# Altium footprint library Dart_Controller_Pcblib.PcbLib: 43 footprints (part 2 of 3)
Each footprint in its own frame and in the unit in brackets; x right, y up, seen from the top. Pads: shape width x height; smd on the part's side, far side on the other; paste and mask are expansions set on the pad; w line width, h text height; cw(c..) or ccw(c..) is an arc to the next point about the centre after c.
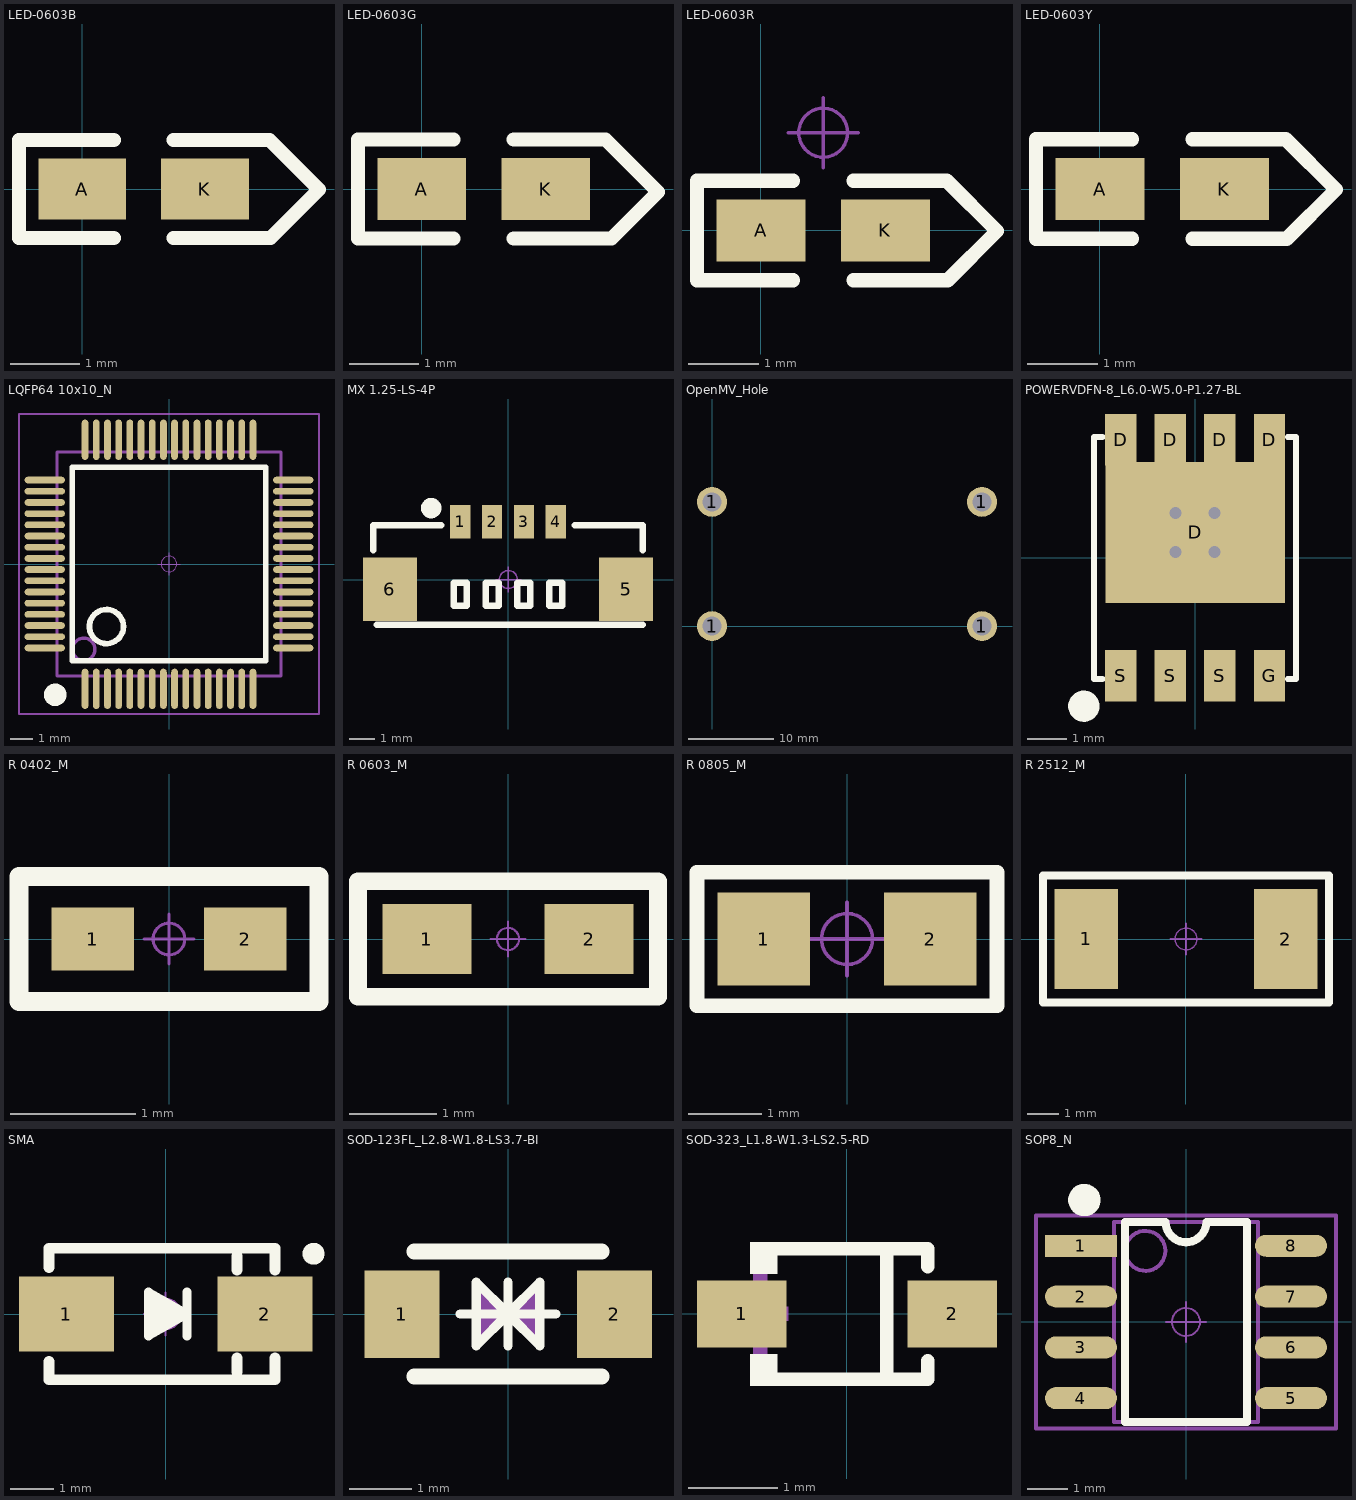
[diagram p1: the footprints below, top view; thin cyan lines are the x and y axes]

## LED-0603B [mil]
height 35.43
pads (2):
  rect 50x35 smd: A(0,0.26) K(70,0.26)
Top Overlay:
  lines w8: 18,-27.74 -36,-27.74 -36,-25.74 -36,28.26 -35,28.26 18,28.26 ; 52,-27.74 107.26,-27.74 135,0 106.74,28.26 106,28.26 52,28.26
3D body "18.STEP": height 23.82, standoff -0.04, extent 3.5,-15 66.5,16.58

## LED-0603G [mil]
height 35.43
pads (2):
  rect 50x35 smd: A(0,0.26) K(70,0.26)
Top Overlay:
  lines w8: 18,-27.74 -36,-27.74 -36,-25.74 -36,28.26 -35,28.26 18,28.26 ; 52,-27.74 107.26,-27.74 133.5,-1.5 103.75,28.26 52,28.26
3D body "17.STEP": height 23.82, standoff -0.04, extent 3.5,-15 66.5,16.58

## LED-0603R [mil]
height 35.43
pads (2):
  rect 50x35 smd: A(0,0) K(70,0)
Top Overlay:
  lines w8: 18,-28 -36,-28 -36,-26 -36,28 -35,28 18,28 ; 52,-28 105,-28 132.75,-0.26 104.49,28 ; 52,28 104.49,28 ; 103.75,28 104.49,28
Mechanical 15:
  circle w1.97: c35,55 r13.78
  lines w1.97: 15.31,55 54.69,55 ; 35,35.31 35,74.69
3D body "LED 0603玻璃罩.": height 0, standoff 0, extent 35,55 35,55
3D body "LED 0603-R.STEP": height 18.36, standoff -0.16, extent 3.5,39.21 66.49,70.78

## LED-0603Y [mil]
height 35.43
pads (2):
  rect 50x35 smd: A(0,0) K(70,0)
Top Overlay:
  lines w8: 18,-28 -36,-28 -36,-26 -36,28 -35,28 18,28 ; 52,-28 105,-28 132.75,-0.26 104.49,28 ; 52,28 104.49,28 ; 103.75,28 104.49,28
3D body "14.STEP": height 23.82, standoff -0.04, extent 3.5,-16.83 66.5,15

## LQFP64 10x10_N [mm]
pads (64):
  oval 0.3x1.8 smd: 1(-3.75,-5.575) 2(-3.25,-5.575) 3(-2.75,-5.575) 4(-2.25,-5.575) 5(-1.75,-5.575) 6(-1.25,-5.575) 7(-0.75,-5.575) 8(-0.25,-5.575) 9(0.25,-5.575) 10(0.75,-5.575) 11(1.25,-5.575) 12(1.75,-5.575) 13(2.25,-5.575) 14(2.75,-5.575) 15(3.25,-5.575) 16(3.75,-5.575) 33(3.75,5.55) 34(3.25,5.55) 35(2.75,5.55) 36(2.25,5.55) 37(1.75,5.55) 38(1.25,5.55) 39(0.75,5.55) 40(0.25,5.55) 41(-0.25,5.55) 42(-0.75,5.55) 43(-1.25,5.55) 44(-1.75,5.55) 45(-2.25,5.55) 46(-2.75,5.55) 47(-3.25,5.55) 48(-3.75,5.55)
  oval 1.8x0.3 smd: 17(5.55,-3.75) 18(5.55,-3.25) 19(5.55,-2.75) 20(5.55,-2.25) 21(5.55,-1.75) 22(5.55,-1.25) 23(5.55,-0.75) 24(5.55,-0.25) 25(5.55,0.25) 26(5.55,0.75) 27(5.55,1.25) 28(5.55,1.75) 29(5.55,2.25) 30(5.55,2.75) 31(5.55,3.25) 32(5.55,3.75) 49(-5.55,3.75) 50(-5.55,3.25) 51(-5.55,2.75) 52(-5.55,2.25) 53(-5.55,1.75) 54(-5.55,1.25) 55(-5.55,0.75) 56(-5.55,0.25) 57(-5.55,-0.25) 58(-5.55,-0.75) 59(-5.55,-1.25) 60(-5.55,-1.75) 61(-5.55,-2.25) 62(-5.55,-2.75) 63(-5.55,-3.25) 64(-5.55,-3.75)
Top Overlay:
  circle w0.254: c-2.794,-2.794 r0.762
  circle w0.508: c-5.08,-5.842 r0.25
  lines w0.254: -4.318,-4.318 -4.318,4.318 4.318,4.318 4.318,-4.318 -4.318,-4.318
Mechanical 13:
  circle w0.15: c-3.81,-3.81 r0.5
  lines w0.15: -5,-5 -5,5 5,5 5,-5 -5,-5
Mechanical 15:
  circle w0.05: c0,0 r0.35
  lines w0.05: -0.5,0 0.5,0 ; 0,-0.5 0,0.5
  lines w0.1: -6.7,-6.7 6.7,-6.7 6.7,6.7 -6.7,6.7 -6.7,-6.7
3D body "LQFP64-10x10.STEP": height 1.45, standoff -0.01, extent -6.003,-6.003 6.003,6.003

## MX 1.25-LS-4P [mm] "长：9.75m，宽：3.7mm，高：4.7mm"
pads (6):
  rect 0.8x1.3 smd: 1(-1.889,2.261) 2(-0.639,2.261) 3(0.611,2.261) 4(1.861,2.261)
  rect 2.1x2.5 smd: 5(4.604,-0.381) 6(-4.632,-0.381)
Top Overlay:
  circle w0.4: c-3.017,2.794 r0.2
  lines w0.254: -5.295,1.143 -5.295,2.134 -2.628,2.134 ; -5.14,-1.778 5.267,-1.778 ; 2.6,2.134 5.267,2.134 5.267,1.143 ; -2.143,-1.016 -2.143,-0.127 -1.635,-0.127 -1.635,-1.016 -2.143,-1.016 ; -0.893,-1.016 -0.385,-1.016 -0.385,-0.127 -0.893,-0.127 -0.893,-1.016 ; 0.357,-1.016 0.865,-1.016 0.865,-0.127 0.357,-0.127 0.357,-1.016 ; 1.607,-1.016 2.115,-1.016 2.115,-0.127 1.607,-0.127 1.607,-1.016
Mechanical 15:
  circle w0.05: c0,0 r0.35
  lines w0.05: -0.5,0 0.5,0 ; 0,-0.5 0,0.5
3D body "MOLEX1.25-LS-4P.STEP": height 4.7, standoff 0, extent -5.075,-1.6 5.075,2.5

## OpenMV_Hole [mm]
pads (4):
  round 3.5 hole 2.2 mask+0: 1(0,0) 1(0,14.5) 1(31.5,0) 1(31.5,14.5)

## POWERVDFN-8_L6.0-W5.0-P1.27-BL [mm]
pads (9):
  rect 0.8x1.321 smd paste-100 mask+0.051: D(-1.905,3.025) D(-0.635,3.025) D(0.635,3.025) D(1.905,3.025) G(1.905,-3.025) S(-1.905,-3.025) S(-0.635,-3.025) S(0.635,-3.025)
  rect 4.6x3.6 smd paste-100 mask+0.051: D(0,0.65)
via -0.5,1.15 diameter 0.61 hole 0.305
via 0.5,1.15 diameter 0.61 hole 0.305
via -0.5,0.15 diameter 0.61 hole 0.305
via 0.5,0.15 diameter 0.61 hole 0.305
Top Overlay:
  circle w0.4: c-2.85,-3.8 r0.2
  lines w0.152: -2.376,-3.101 -2.586,-3.101 -2.586,3.101 -2.376,3.101 ; 2.376,-3.101 2.586,-3.101 2.586,3.101 2.376,3.101
Top Paste:
  region: 2.305,2.365 2.305,3.686 1.505,3.686 1.505,2.45 1.035,2.45 1.035,3.686 0.235,3.686 0.235,2.45 -0.235,2.45 -0.235,3.686 -1.035,3.686 -1.035,2.45 -1.505,2.45 -1.505,3.686 -2.305,3.686 -2.305,2.365 -2.3,2.365 -2.3,-1.15 2.3,-1.15 2.3,2.365
  region: 1.505,-2.365 1.505,-3.686 2.305,-3.686 2.305,-2.365
  region: 1.035,-3.686 1.035,-2.365 0.235,-2.365 0.235,-3.686
  region: -0.235,-3.686 -0.235,-2.365 -1.035,-2.365 -1.035,-3.686
  region: -1.505,-3.686 -1.505,-2.365 -2.305,-2.365 -2.305,-3.686
Mechanical 15:
  circle w0.2: c-1.905,-3.325 r0.1
3D body "PMOS_CORR.step": height 1.01, standoff 0, extent -2.64,-3.05 2.64,3.05

## R 0402_M [mil] "1/16W贴片电阻       淘宝ID:黄晶宝石"
pads (2):
  rect 26x20 smd: 1(-24,0) 2(24,0)
Top Overlay:
  lines w6: -47.24,-19.68 -47.24,19.68 47.24,19.68 47.24,-19.68 -47.24,-19.68
Mechanical 15:
  circle w1: c0,0 r5
  lines w1: -7.87,0 7.87,0 ; 0,-7.87 0,7.87
3D body "R 0402.STEP": height 11.85, standoff -0.09, extent -19.68,-9.84 19.69,9.85

## R 0603_M [mil] "1/10W贴片电阻                             淘宝ID:黄晶宝石"
pads (2):
  rect 40x31.5 smd: 1(-36.5,0) 2(36.5,0)
Top Overlay:
  lines w8: -67.5,-26 67.5,-26 67.5,26 -67.5,26 -67.5,-26
Mechanical 15:
  circle w1: c0,0 r5
  lines w1: -7.87,0 7.87,0 ; 0,-7.87 0,7.87
3D body "R 0603.STEP": height 15.79, standoff -0.13, extent -31.49,-15.74 31.5,15.75

## R 0805_M [mil] "1/8W贴片电阻"
pads (2):
  rect 50x50 smd: 1(-45,0) 2(45,0)
Top Overlay:
  lines w8: -81,-36 81,-36 81,36 -81,36 -81,-36
Mechanical 15:
  circle w1.97: c0,0 r13.78
  lines w1.97: -19.68,0 19.68,0 ; 0,-19.68 0,19.68
3D body "R 0805.STEP": height 19.72, standoff -0.24, extent -39.37,-24.6 39.37,24.61

## R 2512_M [mm] "1W贴片电阻  淘宝ID:黄晶宝石"
pads (2):
  rect 2.032x3.2 smd: 1(-3.2,0) 2(3.2,0)
Top Overlay:
  lines w0.254: -4.572,-2.032 4.572,-2.032 4.572,2.032 -4.572,2.032 -4.572,-2.032
Mechanical 15:
  circle w0.05: c0,0 r0.35
  lines w0.05: -0.5,0 0.5,0 ; 0,-0.5 0,0.5
3D body "R 2512.STEP": height 0.55, standoff -0.02, extent -3.2,-1.6 3.2,1.6

## SMA [mm] "4.5x2.6*2.2mm（长宽高，不包括引脚）"
height 2.54
pads (2):
  rect 2.2x1.75 smd: 1(-2.3,0) 2(2.3,0)
Top Overlay:
  circle w0.254: c3.429,1.397 r0.127
  lines w0.203: 0.494,-0.508 0.494,0.508 ; -0.395,-0.508 -0.395,0.508 0.494,0 -0.395,-0.508
  lines w0.254: -2.7,-1.105 -2.7,-1.524 2.54,-1.524 2.54,-1.016 ; -2.7,1.08 -2.7,1.524 2.54,1.524 2.54,1.016 ; -0.33,0.305 0.305,0 -0.254,-0.305 -0.254,0.051 0.023,0 ; 1.651,-1.35 1.651,-1.016 ; 1.651,1.016 1.651,1.35
Mechanical 15:
  circle w0.05: c0,0 r0.35
  lines w0.05: -0.5,0 0.5,0 ; 0,-0.5 0,0.5
3D body "SMA.STEP": height 2.15, standoff 0.04, extent -2.528,-1.3 2.575,1.3

## SOD-123FL_L2.8-W1.8-LS3.7-BI [mm]
pads (2):
  rect 1.2x1.4 smd paste+0 mask+0.051: 1(-1.7,0) 2(1.7,0)
Top Overlay:
  lines w0.15: -0.762,0 0.762,0 ; 0,-0.508 0,0.508 ; 0,-0.254 0,0.254 ; 0,0 0.508,0.508 0.508,-0.508 0,0 ; 0,0 -0.508,-0.508 -0.508,0.508 0,0
  lines w0.254: -1.5,-1 1.5,-1 ; -1.5,1 1.5,1
Mechanical 15:
  region: -0.5,0.5 -0.5,-0.5 0,0
  region: 0.5,-0.5 0.5,0.5 0,0
3D body "SOD-123F.STEP": height 1.15, standoff 0.04, extent -1.9,-0.8 1.9,0.8

## SOD-323_L1.8-W1.3-LS2.5-RD [mm]
height 0.9
pads (2):
  rect 1x0.75 smd: 1(-1.173,0) 2(1.173,0)
Top Overlay:
  region: -0.775,0.802 -0.775,0.45 -1.08,0.45 -1.08,0.802
  region: -0.775,-0.802 -0.775,-0.45 -1.08,-0.45 -1.08,-0.802
  lines w0.152: -0.851,-0.726 0.901,-0.726 0.901,-0.52 ; -0.851,0.726 0.901,0.726 0.901,0.53 ; 0.442,-0.726 0.442,0.726
Mechanical 15:
  region: 0.831,0.127 0.831,-0.029 1.455,-0.029 1.455,0.127
  region: -0.657,0.08 -0.657,-0.076 -1.281,-0.076 -1.281,0.08
  region: -0.889,0.52 -0.889,-0.52 -1.045,-0.52 -1.045,0.52
3D body "SOD-323.STEP": height 1, standoff 0.04, extent -1.337,-0.631 1.311,0.669

## SOP8_N [mm]
pads (8):
  rect 1.8x0.55 smd: 1(-2.625,1.905)
  oval 1.8x0.55 smd: 2(-2.625,0.635) 3(-2.625,-0.635) 4(-2.625,-1.905) 5(2.625,-1.905) 6(2.625,-0.635) 7(2.625,0.635) 8(2.625,1.905)
Top Overlay:
  circle w0.5: c-2.54,3.048 r0.155
  lines w0.2: -1.524,2.5 -1.524,-2.5 1.524,-2.5 1.524,2.5
  lines w0.203: -1.524,2.5 -0.508,2.5 ccw(c0,2.5) 0,1.992 ccw(c0,2.5) 0.508,2.5 1.524,2.5
Mechanical 13:
  circle w0.1: c-1.016,1.778 r0.5
  lines w0.1: -1.8,-2.5 -1.8,2.5 1.8,2.5 1.8,-2.5 -1.8,-2.5
Mechanical 15:
  circle w0.05: c0,0 r0.35
  lines w0.05: -0.5,0 0.5,0 ; 0,-0.5 0,0.5
  lines w0.1: -3.75,-2.667 3.75,-2.667 3.75,2.667 -3.75,2.667 -3.75,-2.667
3D body "SOP8.STEP": height 1.9, standoff 0, extent -3.003,-2.5 3.003,2.5